# Altium footprint library BluetoothAdapter.PcbLib: 29 footprints (part 2 of 2)
Each footprint in its own frame and in the unit in brackets; x right, y up, seen from the top. Pads: shape width x height; smd on the part's side, far side on the other; paste and mask are expansions set on the pad; w line width, h text height; cw(c..) or ccw(c..) is an arc to the next point about the centre after c.
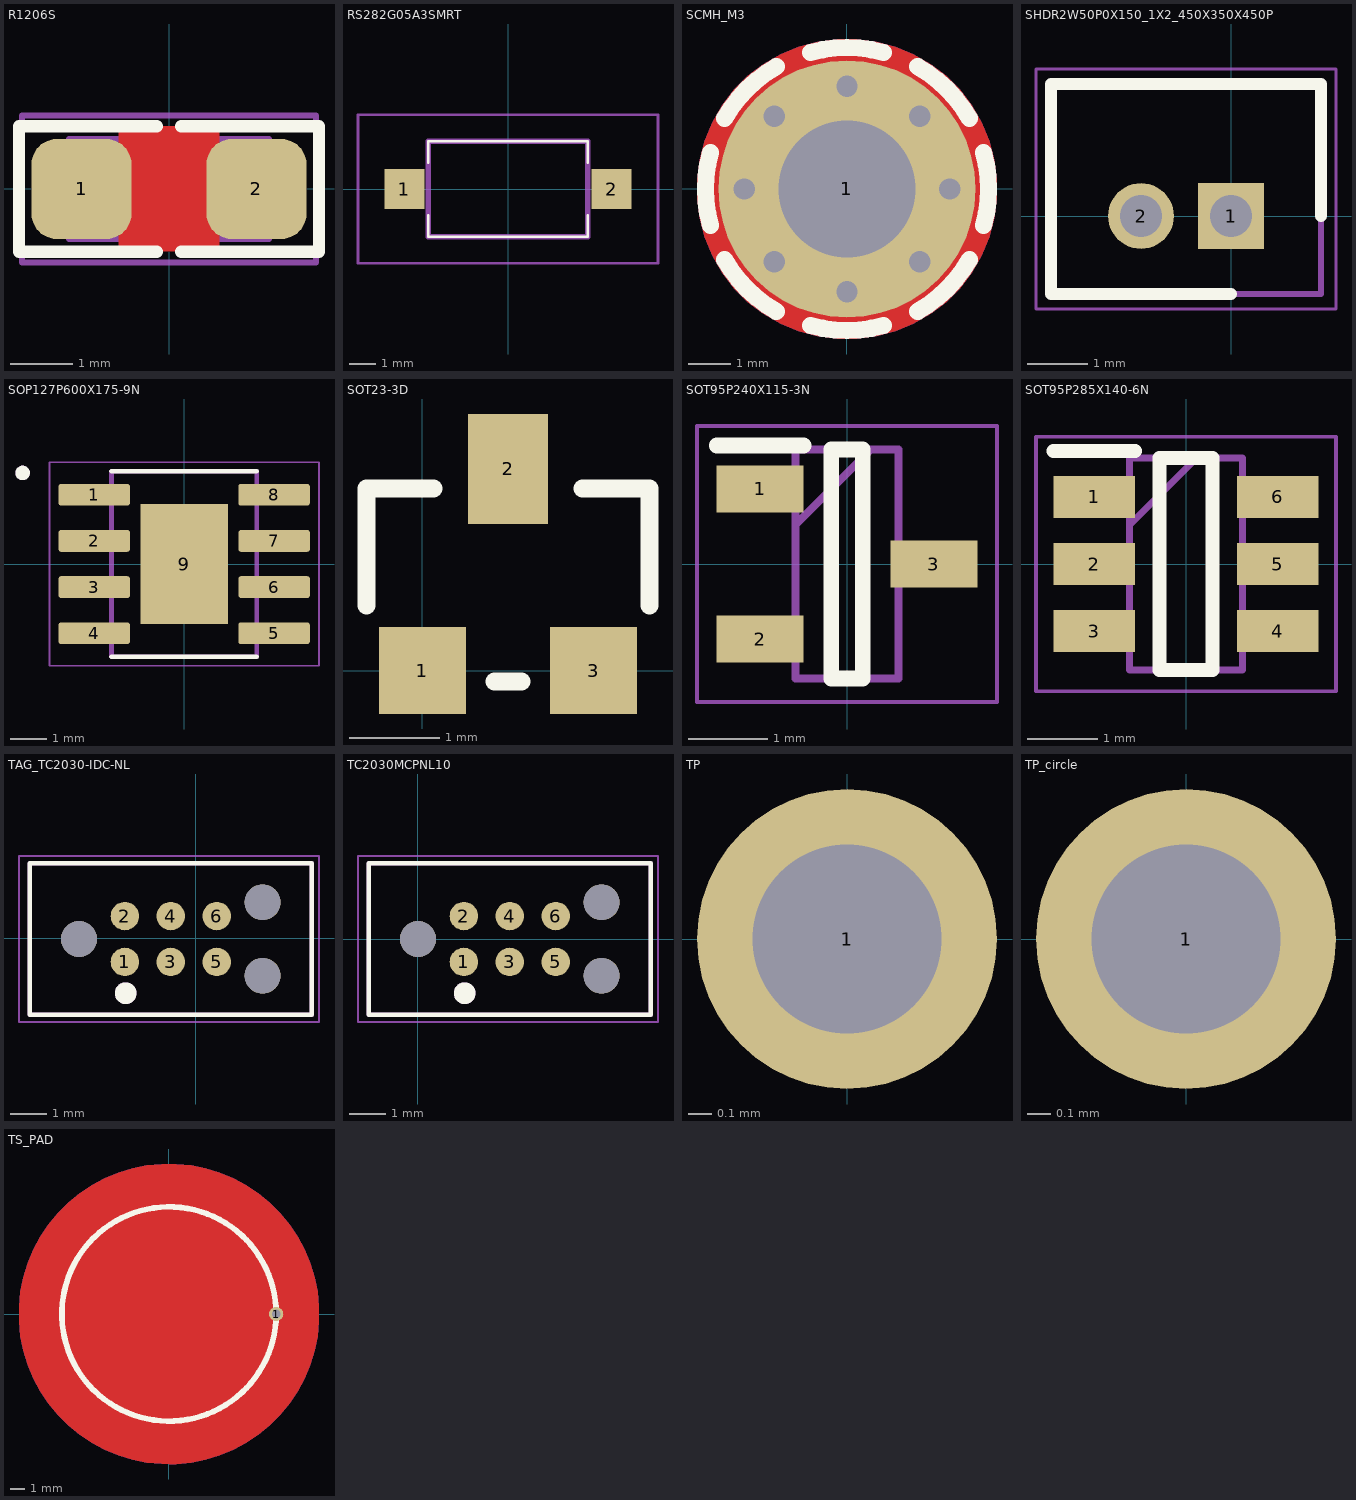
[diagram p1: the footprints below, top view; thin cyan lines are the x and y axes]

## R1206S [mm] "CHIP RESISTOR 1/4 WATT, Body 3.2x1.6mm,1206, 3216, soldered"
height 2
pads (2):
  rrect50% 1.6x1.6 smd mask+0.075: 1(-1.4,0) 2(1.4,0)
Top Layer:
  pour cut-out: -0.8,1 -0.8,-1 0.8,-1 0.8,1
Top Overlay:
  lines w0.2: -2.4,-1 -0.2,-1 ; -2.4,-1 -2.4,1 -0.2,1 ; 0.2,-1 2.4,-1 ; 0.2,1 2.4,1 2.4,-1
Mechanical 13:
  lines w0.1: -1.6,-0.8 -1.6,0.8 1.6,0.8 1.6,-0.8 -1.6,-0.8
Mechanical 15:
  lines w0.1: -0.5,0 0.5,0 ; 0,-0.5 0,0.5 ; -2.35,-1.175 -2.35,1.175 2.35,1.175 2.35,-1.175 -2.35,-1.175
3D body "r1206_Res1.step": height 1.25, standoff 0, extent -2.27,-0.8 2.27,0.8

## RS282G05A3SMRT [mm]
pads (2):
  rect 1.5x1.5 smd: 1(-3.9,0) 2(3.9,0)
Top Overlay:
  lines w0.1: -3,-1 -3,-1.8 3,-1.8 3,-1 ; -3,1 -3,1.8 3,1.8 3,1
Mechanical 13:
  lines w0.2: -3,-1.8 3,-1.8 3,1.8 -3,1.8 -3,-1.8
Mechanical 15:
  lines w0.1: -5.65,-2.8 5.65,-2.8 5.65,2.8 -5.65,2.8 -5.65,-2.8
3D body "RS-282G05A3-SMRT_CNK.step": height 2.49, standoff 0, extent -4.65,-1.803 4.65,1.803

## SCMH_M3 [mm] "SCREW mouting, M3, 3.0mm diameter and 6.0mm PanHead"
height 8
pads (1):
  round 6 / inner round 3.5 / far side round 6 hole 3.2 mask+0.1: 1(0,0)
via 0,2.4 diameter 0.8 hole 0.5
via 0,-2.4 diameter 0.8 hole 0.5
via 1.697,-1.697 diameter 0.8 hole 0.5
via -1.697,1.697 diameter 0.8 hole 0.5
via 2.4,0 diameter 0.8 hole 0.5
via -2.4,0 diameter 0.8 hole 0.5
via 1.697,1.697 diameter 0.8 hole 0.5
via -1.697,-1.697 diameter 0.8 hole 0.5
Top Layer:
  pour cut-out: 0,3.5 -0.229,3.5 -0.684,3.44 -1.127,3.321 -1.551,3.146 -1.949,2.916 -2.313,2.637 -2.637,2.313 -2.916,1.949 -3.146,1.551 -3.321,1.127 -3.44,0.684 -3.5,0.229 -3.5,0 -3.5,-0.229 -3.44,-0.684 -3.321,-1.127 -3.146,-1.551 -2.916,-1.949 -2.637,-2.313 -2.313,-2.637 -1.949,-2.916 -1.551,-3.146 -1.127,-3.321 -0.684,-3.44 -0.229,-3.5 0,-3.5 0.229,-3.5 0.684,-3.44 1.127,-3.321 1.551,-3.146 1.949,-2.916 2.313,-2.637 2.637,-2.313 2.916,-1.949 3.146,-1.551 3.321,-1.127 3.44,-0.684 3.5,-0.229 3.5,0 3.5,0.229 3.44,0.684 3.321,1.127 3.146,1.551 2.916,1.949 2.637,2.313 2.313,2.637 1.949,2.916 1.551,3.146 1.127,3.321 0.684,3.44 0.229,3.5
Bottom Layer:
  pour cut-out: 0,3.5 -0.229,3.5 -0.684,3.44 -1.127,3.321 -1.551,3.146 -1.949,2.916 -2.313,2.637 -2.637,2.313 -2.916,1.949 -3.146,1.551 -3.321,1.127 -3.44,0.684 -3.5,0.229 -3.5,0 -3.5,-0.229 -3.44,-0.684 -3.321,-1.127 -3.146,-1.551 -2.916,-1.949 -2.637,-2.313 -2.313,-2.637 -1.949,-2.916 -1.551,-3.146 -1.127,-3.321 -0.684,-3.44 -0.229,-3.5 0,-3.5 0.229,-3.5 0.684,-3.44 1.127,-3.321 1.551,-3.146 1.949,-2.916 2.313,-2.637 2.637,-2.313 2.916,-1.949 3.146,-1.551 3.321,-1.127 3.44,-0.684 3.5,-0.229 3.5,0 3.5,0.229 3.44,0.684 3.321,1.127 3.146,1.551 2.916,1.949 2.637,2.313 2.313,2.637 1.949,2.916 1.551,3.146 1.127,3.321 0.684,3.44 0.229,3.5
Top Overlay:
  lines w0.4: -3.188,-0.854 cw(c0,0) -3.188,0.854 ; -2.858,-1.65 ccw(c0,0) -1.65,-2.858 ; -2.858,1.65 cw(c0,0) -1.65,2.858 ; -0.854,-3.188 ccw(c0,0) 0.854,-3.188 ; -0.854,3.188 cw(c0,0) 0.854,3.188 ; 1.65,-2.858 ccw(c0,0) 2.858,-1.65 ; 1.65,2.858 cw(c0,0) 2.858,1.65 ; 3.188,-0.854 ccw(c0,0) 3.188,0.854

## SHDR2W50P0X150_1X2_450X350X450P [mm]
pads (2):
  rect 1.1x1.1 hole 0.7: 1(0,0)
  round 1.1 hole 0.7: 2(-1.5,0)
Top Overlay:
  lines w0.2: 0,-1.3 -3,-1.3 -3,2.2 1.5,2.2 1.5,0
Mechanical 13:
  lines w0.1: -3,-1.3 -3,2.2 1.5,2.2 1.5,-1.3 -3,-1.3
Mechanical 15:
  lines w0.05: -3.25,-1.55 -3.25,2.45 1.75,2.45 1.75,-1.55 -3.25,-1.55
3D body "Conn_JST_B2B-ZR_LF_SN_eec.STEP": height 4.5, standoff -2.7, extent -3.007,-1.323 1.493,2.177

## SOP127P600X175-9N [mm]
pads (9):
  rrect25% 1.97x0.6 smd: 1(-2.475,1.905) 2(-2.475,0.635) 3(-2.475,-0.635) 4(-2.475,-1.905) 5(2.475,-1.905) 6(2.475,-0.635) 7(2.475,0.635) 8(2.475,1.905)
  rect 2.413x3.302 smd paste-3: 9(0,0)
Top Overlay:
  circle w0.2: c-4.445,2.505 r0.1
  lines w0.127: -2,-2.55 2,-2.55 ; -2,2.55 2,2.55
Mechanical 13:
  circle w0.2: c-4.445,2.505 r0.1
  lines w0.127: -2,-2.55 2,-2.55 2,2.55 -2,2.55 -2,-2.55
Mechanical 15:
  lines w0.05: -3.71,-2.8 3.71,-2.8 3.71,2.8 -3.71,2.8 -3.71,-2.8
3D body "step_temp.STEP": height 1.7, standoff 0, extent -3,-2.45 3,2.45

## SOT23-3D [mm]
pads (3):
  rect 0.965x0.965 smd: 1(0,0) 3(1.9,0)
  rect 0.889x1.219 smd: 2(0.95,2.24)
Top Overlay:
  lines w0.2: -0.62,0.72 -0.62,2.02 0.125,2.02 ; 0.8,-0.119 1.1,-0.119 ; 1.775,2.02 2.52,2.02 2.52,0.72
3D body "DBZ0003A.stp": height 1, standoff 0, extent -0.51,-0.15 2.41,2.39

## SOT95P240X115-3N [mm]
pads (3):
  rect 1.1x0.6 smd: 1(-1.1,0.95) 2(-1.1,-0.95) 3(1.1,0)
Top Overlay:
  lines w0.2: -1.65,1.5 -0.55,1.5 ; -0.2,-1.45 -0.2,1.45 0.2,1.45 0.2,-1.45 -0.2,-1.45
Mechanical 13:
  lines w0.1: -0.65,0.5 0.3,1.45 ; -0.65,-1.45 -0.65,1.45 0.65,1.45 0.65,-1.45 -0.65,-1.45
Mechanical 15:
  lines w0.05: -1.9,-1.75 -1.9,1.75 1.9,1.75 1.9,-1.75 -1.9,-1.75
3D body "MMBT2222A-G.stp": height 1.15, standoff 0, extent -1.2,-1.45 1.2,1.45

## SOT95P285X140-6N [mm]
pads (6):
  rect 1.15x0.6 smd: 1(-1.3,0.95) 2(-1.3,0) 3(-1.3,-0.95) 4(1.3,-0.95) 5(1.3,0) 6(1.3,0.95)
Top Overlay:
  lines w0.2: -1.875,1.6 -0.725,1.6 ; -0.375,-1.5 0.375,-1.5 0.375,1.5 -0.375,1.5 -0.375,-1.5
Mechanical 13:
  lines w0.1: -0.8,0.55 0.15,1.5 ; -0.8,-1.5 0.8,-1.5 0.8,1.5 -0.8,1.5 -0.8,-1.5
Mechanical 15:
  lines w0.05: -2.125,-1.8 2.125,-1.8 2.125,1.8 -2.125,1.8 -2.125,-1.8
3D body "ZXMP3A17E6TA.stp": height 1.4, standoff 0, extent -1.425,-1.5 1.425,1.5

## TAG_TC2030-IDC-NL [mm]
pads (9):
  round 0.787 smd paste-1: 1(-1.961,-0.66) 2(-1.961,0.61) 3(-0.691,-0.66) 4(-0.691,0.61) 5(0.579,-0.66) 6(0.579,0.61)
  round 0.991 hole 0.991 unplated: ""(-3.231,-0.025) ""(1.849,-1.041) ""(1.849,0.991)
Top Overlay:
  circle w0.3: c-1.941,-1.525 r0.15
  lines w0.127: -4.591,-2.125 -4.591,2.075 3.209,2.075 3.209,-2.125 -4.591,-2.125
Mechanical 13:
  circle w0.3: c-1.941,-1.525 r0.15
  lines w0.127: -4.591,-2.125 3.209,-2.125 3.209,2.075 -4.591,2.075 -4.591,-2.125
Mechanical 15:
  lines w0.05: -4.891,-2.325 3.409,-2.325 3.409,2.275 -4.891,2.275 -4.891,-2.325

## TC2030MCPNL10 [mil]
height 70.87
pads (9):
  round 30.98 smd paste-39.37: 1(50,-25) 2(50,25) 3(100,-25) 4(100,25) 5(150,-25) 6(150,25)
  round 39.02 hole 39.02 unplated: ""(0,0) ""(200,-40) ""(200,40)
Top Overlay:
  circle w11.81: c50.79,-59.06 r5.91
  lines w5: -53.54,-82.68 253.54,-82.68 253.54,82.68 -53.54,82.68 -53.54,-82.68
Mechanical 13:
  circle w11.81: c50.79,-59.06 r5.91
  lines w5: -53.54,-82.68 -53.54,82.68 253.54,82.68 253.54,-82.68 -53.54,-82.68
Mechanical 15:
  lines w1.97: -65.35,-90.55 -65.35,90.55 261.42,90.55 261.42,-90.55 -65.35,-90.55

## TP [mm]
pads (1):
  round 1.27 hole 0.8: 1(0,0)

## TP_circle [mm]
pads (1):
  round 1.27 hole 0.8: 1(0,0)
3D body "User Library-Test Point Keystone - 5000 RED.STEP": height 4.57, standoff -3.05, extent -1.27,-1.27 1.27,1.27

## TS_PAD [mm]
height 1.8
pads (1):
  round 1 hole 0.6 mask+0.102: 1(7.507,0.035)
Top Layer:
  region: 0.007,7.535 -0.361,7.535 -1.095,7.463 -1.818,7.319 -2.523,7.105 -3.204,6.823 -3.853,6.476 -4.466,6.066 -5.036,5.599 -5.557,5.078 -6.024,4.508 -6.434,3.895 -6.781,3.246 -7.063,2.565 -7.277,1.86 -7.421,1.137 -7.493,0.403 -7.493,0.035 -7.493,-0.333 -7.421,-1.067 -7.277,-1.79 -7.063,-2.495 -6.781,-3.176 -6.434,-3.825 -6.024,-4.438 -5.557,-5.008 -5.036,-5.529 -4.466,-5.996 -3.853,-6.406 -3.204,-6.753 -2.523,-7.035 -1.818,-7.249 -1.095,-7.393 -0.361,-7.465 0.007,-7.465 0.375,-7.465 1.109,-7.393 1.832,-7.249 2.537,-7.035 3.218,-6.753 3.867,-6.406 4.48,-5.996 5.05,-5.529 5.571,-5.008 6.038,-4.438 6.448,-3.825 6.795,-3.176 7.077,-2.495 7.291,-1.79 7.435,-1.067 7.507,-0.333 7.507,0.035 7.507,0.403 7.435,1.137 7.291,1.86 7.077,2.565 6.795,3.246 6.448,3.895 6.038,4.508 5.571,5.078 5.05,5.599 4.48,6.066 3.867,6.476 3.218,6.823 2.537,7.105 1.832,7.319 1.109,7.463 0.375,7.535
  pour cut-out: 0.007,-10.465 0.523,-10.465 1.55,-10.364 2.561,-10.163 3.549,-9.863 4.502,-9.468 5.412,-8.982 6.269,-8.409 7.067,-7.754 7.796,-7.025 8.451,-6.227 9.024,-5.37 9.51,-4.46 9.905,-3.507 10.205,-2.519 10.406,-1.508 10.507,-0.481 10.507,0.035 10.507,0.551 10.406,1.578 10.205,2.589 9.905,3.577 9.51,4.53 9.024,5.44 8.451,6.297 7.796,7.095 7.067,7.824 6.269,8.479 5.412,9.052 4.502,9.538 3.549,9.933 2.561,10.233 1.55,10.434 0.523,10.535 0.007,10.535 -0.509,10.535 -1.536,10.434 -2.547,10.233 -3.535,9.933 -4.488,9.538 -5.398,9.052 -6.255,8.479 -7.053,7.824 -7.782,7.095 -8.437,6.297 -9.01,5.44 -9.496,4.53 -9.891,3.577 -10.191,2.589 -10.392,1.578 -10.493,0.551 -10.493,0.035 -10.493,-0.481 -10.392,-1.508 -10.191,-2.519 -9.891,-3.507 -9.496,-4.46 -9.01,-5.37 -8.437,-6.227 -7.782,-7.025 -7.053,-7.754 -6.255,-8.409 -5.398,-8.982 -4.488,-9.468 -3.535,-9.863 -2.547,-10.163 -1.536,-10.364 -0.509,-10.465
Bottom Layer:
  pour cut-out: 0.007,-10.465 0.523,-10.465 1.55,-10.364 2.561,-10.163 3.549,-9.863 4.502,-9.468 5.412,-8.982 6.269,-8.409 7.067,-7.754 7.796,-7.025 8.451,-6.227 9.024,-5.37 9.51,-4.46 9.905,-3.507 10.205,-2.519 10.406,-1.508 10.507,-0.481 10.507,0.035 10.507,0.551 10.406,1.578 10.205,2.589 9.905,3.577 9.51,4.53 9.024,5.44 8.451,6.297 7.796,7.095 7.067,7.824 6.269,8.479 5.412,9.052 4.502,9.538 3.549,9.933 2.561,10.233 1.55,10.434 0.523,10.535 0.007,10.535 -0.509,10.535 -1.536,10.434 -2.547,10.233 -3.535,9.933 -4.488,9.538 -5.398,9.052 -6.255,8.479 -7.053,7.824 -7.782,7.095 -8.437,6.297 -9.01,5.44 -9.496,4.53 -9.891,3.577 -10.191,2.589 -10.392,1.578 -10.493,0.551 -10.493,0.035 -10.493,-0.481 -10.392,-1.508 -10.191,-2.519 -9.891,-3.507 -9.496,-4.46 -9.01,-5.37 -8.437,-6.227 -7.782,-7.025 -7.053,-7.754 -6.255,-8.409 -5.398,-8.982 -4.488,-9.468 -3.535,-9.863 -2.547,-10.163 -1.536,-10.364 -0.509,-10.465
Top Overlay:
  circle w0.4: c0.007,0.035 r7.5